# Altium footprint library Connector_Samtec_HLE_SMD.PcbLib: 290 footprints (part 8 of 24) (continued)
## Samtec_HLE-122-02-xxx-DV-BE_2x22_P2.54mm_Horizontal [mm]
pads (88):
  rect 1.27x1.68 smd: 1(-26.67,2.72) 2(-26.67,-2.72) 3(-24.13,2.72) 4(-24.13,-2.72) 5(-21.59,2.72) 6(-21.59,-2.72) 7(-19.05,2.72) 8(-19.05,-2.72) 9(-16.51,2.72) 10(-16.51,-2.72) 11(-13.97,2.72) 12(-13.97,-2.72) 13(-11.43,2.72) 14(-11.43,-2.72) 15(-8.89,2.72) 16(-8.89,-2.72) 17(-6.35,2.72) 18(-6.35,-2.72) 19(-3.81,2.72) 20(-3.81,-2.72) 21(-1.27,2.72) 22(-1.27,-2.72) 23(1.27,2.72) 24(1.27,-2.72) 25(3.81,2.72) 26(3.81,-2.72) 27(6.35,2.72) 28(6.35,-2.72) 29(8.89,2.72) 30(8.89,-2.72) 31(11.43,2.72) 32(11.43,-2.72) 33(13.97,2.72) 34(13.97,-2.72) 35(16.51,2.72) 36(16.51,-2.72) 37(19.05,2.72) 38(19.05,-2.72) 39(21.59,2.72) 40(21.59,-2.72) 41(24.13,2.72) 42(24.13,-2.72) 43(26.67,2.72) 44(26.67,-2.72)
  round 0.97 hole 0.97: Un1(11.43,-1.27) Un2(26.67,-1.27) Un3(-6.35,-1.27) Un4(13.97,1.27) Un5(6.35,1.27) Un6(-3.81,1.27) Un7(-21.59,-1.27) Un8(-26.67,1.27) Un9(3.81,1.27) Un10(-19.05,-1.27) Un11(1.27,1.27) Un12(11.43,1.27) Un13(1.27,-1.27) Un14(24.13,1.27) Un15(-13.97,-1.27) Un16(6.35,-1.27) Un17(-19.05,1.27) Un18(-13.97,1.27) Un19(3.81,-1.27) Un20(-16.51,-1.27) Un21(-11.43,1.27) Un22(-24.13,-1.27) Un23(-21.59,1.27) Un24(26.67,1.27) Un25(-24.13,1.27) Un26(-26.67,-1.27) Un27(-8.89,1.27) Un28(21.59,-1.27) Un29(13.97,-1.27) Un30(-8.89,-1.27) Un31(24.13,-1.27) Un32(-3.81,-1.27) Un33(21.59,1.27) Un34(8.89,1.27) Un35(8.89,-1.27) Un36(-1.27,-1.27) Un37(16.51,-1.27) Un38(-11.43,-1.27) Un39(-16.51,1.27) Un40(-6.35,1.27) Un41(-1.27,1.27) Un42(16.51,1.27) Un43(19.05,-1.27) Un44(19.05,1.27)
F.SilkS:
  lines w0.12: -27.565,-2.65 -28.05,-2.65 -28.05,2.65 -27.565,2.65 -27.565,3.56 ; -25.775,-2.65 -25.025,-2.65 ; -25.775,2.65 -25.025,2.65 ; -23.235,-2.65 -22.485,-2.65 ; -23.235,2.65 -22.485,2.65 ; -20.695,-2.65 -19.945,-2.65 ; -20.695,2.65 -19.945,2.65 ; -18.155,-2.65 -17.405,-2.65 ; -18.155,2.65 -17.405,2.65 ; -15.615,-2.65 -14.865,-2.65 ; -15.615,2.65 -14.865,2.65 ; -13.075,-2.65 -12.325,-2.65 ; -13.075,2.65 -12.325,2.65 ; -10.535,-2.65 -9.785,-2.65 ; -10.535,2.65 -9.785,2.65 ; -7.995,-2.65 -7.245,-2.65 ; -7.995,2.65 -7.245,2.65 ; -5.455,-2.65 -4.705,-2.65 ; -5.455,2.65 -4.705,2.65 ; -2.915,-2.65 -2.165,-2.65 ; -2.915,2.65 -2.165,2.65 ; -0.375,-2.65 0.375,-2.65 ; -0.375,2.65 0.375,2.65 ; 2.165,-2.65 2.915,-2.65 ; 2.165,2.65 2.915,2.65 ; 4.705,-2.65 5.455,-2.65 ; 4.705,2.65 5.455,2.65 ; 7.245,-2.65 7.995,-2.65 ; 7.245,2.65 7.995,2.65 ; 9.785,-2.65 10.535,-2.65 ; 9.785,2.65 10.535,2.65 ; 12.325,-2.65 13.075,-2.65 ; 12.325,2.65 13.075,2.65 ; 14.865,-2.65 15.615,-2.65 ; 14.865,2.65 15.615,2.65 ; 17.405,-2.65 18.155,-2.65 ; 17.405,2.65 18.155,2.65 ; 19.945,-2.65 20.695,-2.65 ; 19.945,2.65 20.695,2.65 ; 22.485,-2.65 23.235,-2.65 ; 22.485,2.65 23.235,2.65 ; 25.025,-2.65 25.775,-2.65 ; 25.025,2.65 25.775,2.65 ; 27.565,-2.65 28.05,-2.65 28.05,2.65 27.565,2.65
F.CrtYd:
  lines w0.05: -28.44,-4.06 -28.44,4.06 28.44,4.06 28.44,-4.06 -28.44,-4.06
F.Fab:
  lines w0.1: -27.17,2.54 -26.67,1.833 -26.17,2.54 ; -27.94,-2.54 -27.94,2.54 27.94,2.54 27.94,-2.54 -27.94,-2.54
  text "'.Designator'" at -4.047,-2.68 h1

## Samtec_HLE-122-02-xxx-DV-LC_2x22_P2.54mm_Horizontal [mm]
pads (46):
  rect 1.27x2.29 smd: 1(-26.67,2.525) 2(-26.67,-2.525) 3(-24.13,2.525) 4(-24.13,-2.525) 5(-21.59,2.525) 6(-21.59,-2.525) 7(-19.05,2.525) 8(-19.05,-2.525) 9(-16.51,2.525) 10(-16.51,-2.525) 11(-13.97,2.525) 12(-13.97,-2.525) 13(-11.43,2.525) 14(-11.43,-2.525) 15(-8.89,2.525) 16(-8.89,-2.525) 17(-6.35,2.525) 18(-6.35,-2.525) 19(-3.81,2.525) 20(-3.81,-2.525) 21(-1.27,2.525) 22(-1.27,-2.525) 23(1.27,2.525) 24(1.27,-2.525) 25(3.81,2.525) 26(3.81,-2.525) 27(6.35,2.525) 28(6.35,-2.525) 29(8.89,2.525) 30(8.89,-2.525) 31(11.43,2.525) 32(11.43,-2.525) 33(13.97,2.525) 34(13.97,-2.525) 35(16.51,2.525) 36(16.51,-2.525) 37(19.05,2.525) 38(19.05,-2.525) 39(21.59,2.525) 40(21.59,-2.525) 41(24.13,2.525) 42(24.13,-2.525) 43(26.67,2.525) 44(26.67,-2.525)
  round 1.19 hole 1.19: Un1(-25.4,0) Un2(25.4,0)
F.SilkS:
  lines w0.12: -27.565,-2.65 -28.05,-2.65 -28.05,2.65 -27.565,2.65 -27.565,3.67 ; -25.775,-2.65 -25.025,-2.65 ; -25.775,2.65 -25.025,2.65 ; -23.235,-2.65 -22.485,-2.65 ; -23.235,2.65 -22.485,2.65 ; -20.695,-2.65 -19.945,-2.65 ; -20.695,2.65 -19.945,2.65 ; -18.155,-2.65 -17.405,-2.65 ; -18.155,2.65 -17.405,2.65 ; -15.615,-2.65 -14.865,-2.65 ; -15.615,2.65 -14.865,2.65 ; -13.075,-2.65 -12.325,-2.65 ; -13.075,2.65 -12.325,2.65 ; -10.535,-2.65 -9.785,-2.65 ; -10.535,2.65 -9.785,2.65 ; -7.995,-2.65 -7.245,-2.65 ; -7.995,2.65 -7.245,2.65 ; -5.455,-2.65 -4.705,-2.65 ; -5.455,2.65 -4.705,2.65 ; -2.915,-2.65 -2.165,-2.65 ; -2.915,2.65 -2.165,2.65 ; -0.375,-2.65 0.375,-2.65 ; -0.375,2.65 0.375,2.65 ; 2.165,-2.65 2.915,-2.65 ; 2.165,2.65 2.915,2.65 ; 4.705,-2.65 5.455,-2.65 ; 4.705,2.65 5.455,2.65 ; 7.245,-2.65 7.995,-2.65 ; 7.245,2.65 7.995,2.65 ; 9.785,-2.65 10.535,-2.65 ; 9.785,2.65 10.535,2.65 ; 12.325,-2.65 13.075,-2.65 ; 12.325,2.65 13.075,2.65 ; 14.865,-2.65 15.615,-2.65 ; 14.865,2.65 15.615,2.65 ; 17.405,-2.65 18.155,-2.65 ; 17.405,2.65 18.155,2.65 ; 19.945,-2.65 20.695,-2.65 ; 19.945,2.65 20.695,2.65 ; 22.485,-2.65 23.235,-2.65 ; 22.485,2.65 23.235,2.65 ; 25.025,-2.65 25.775,-2.65 ; 25.025,2.65 25.775,2.65 ; 27.565,-2.65 28.05,-2.65 28.05,2.65 27.565,2.65
F.CrtYd:
  lines w0.05: -28.44,-4.17 -28.44,4.17 28.44,4.17 28.44,-4.17 -28.44,-4.17
F.Fab:
  lines w0.1: -27.17,2.54 -26.67,1.833 -26.17,2.54 ; -27.94,-2.54 -27.94,2.54 27.94,2.54 27.94,-2.54 -27.94,-2.54
  text "'.Designator'" at -4.047,-2.68 h1

## Samtec_HLE-122-02-xxx-DV_2x22_P2.54mm_Horizontal [mm]
pads (44):
  rect 1.27x2.29 smd: 1(-26.67,2.525) 2(-26.67,-2.525) 3(-24.13,2.525) 4(-24.13,-2.525) 5(-21.59,2.525) 6(-21.59,-2.525) 7(-19.05,2.525) 8(-19.05,-2.525) 9(-16.51,2.525) 10(-16.51,-2.525) 11(-13.97,2.525) 12(-13.97,-2.525) 13(-11.43,2.525) 14(-11.43,-2.525) 15(-8.89,2.525) 16(-8.89,-2.525) 17(-6.35,2.525) 18(-6.35,-2.525) 19(-3.81,2.525) 20(-3.81,-2.525) 21(-1.27,2.525) 22(-1.27,-2.525) 23(1.27,2.525) 24(1.27,-2.525) 25(3.81,2.525) 26(3.81,-2.525) 27(6.35,2.525) 28(6.35,-2.525) 29(8.89,2.525) 30(8.89,-2.525) 31(11.43,2.525) 32(11.43,-2.525) 33(13.97,2.525) 34(13.97,-2.525) 35(16.51,2.525) 36(16.51,-2.525) 37(19.05,2.525) 38(19.05,-2.525) 39(21.59,2.525) 40(21.59,-2.525) 41(24.13,2.525) 42(24.13,-2.525) 43(26.67,2.525) 44(26.67,-2.525)
F.SilkS:
  lines w0.12: -27.565,-2.65 -28.05,-2.65 -28.05,2.65 -27.565,2.65 -27.565,3.67 ; -25.775,-2.65 -25.025,-2.65 ; -25.775,2.65 -25.025,2.65 ; -23.235,-2.65 -22.485,-2.65 ; -23.235,2.65 -22.485,2.65 ; -20.695,-2.65 -19.945,-2.65 ; -20.695,2.65 -19.945,2.65 ; -18.155,-2.65 -17.405,-2.65 ; -18.155,2.65 -17.405,2.65 ; -15.615,-2.65 -14.865,-2.65 ; -15.615,2.65 -14.865,2.65 ; -13.075,-2.65 -12.325,-2.65 ; -13.075,2.65 -12.325,2.65 ; -10.535,-2.65 -9.785,-2.65 ; -10.535,2.65 -9.785,2.65 ; -7.995,-2.65 -7.245,-2.65 ; -7.995,2.65 -7.245,2.65 ; -5.455,-2.65 -4.705,-2.65 ; -5.455,2.65 -4.705,2.65 ; -2.915,-2.65 -2.165,-2.65 ; -2.915,2.65 -2.165,2.65 ; -0.375,-2.65 0.375,-2.65 ; -0.375,2.65 0.375,2.65 ; 2.165,-2.65 2.915,-2.65 ; 2.165,2.65 2.915,2.65 ; 4.705,-2.65 5.455,-2.65 ; 4.705,2.65 5.455,2.65 ; 7.245,-2.65 7.995,-2.65 ; 7.245,2.65 7.995,2.65 ; 9.785,-2.65 10.535,-2.65 ; 9.785,2.65 10.535,2.65 ; 12.325,-2.65 13.075,-2.65 ; 12.325,2.65 13.075,2.65 ; 14.865,-2.65 15.615,-2.65 ; 14.865,2.65 15.615,2.65 ; 17.405,-2.65 18.155,-2.65 ; 17.405,2.65 18.155,2.65 ; 19.945,-2.65 20.695,-2.65 ; 19.945,2.65 20.695,2.65 ; 22.485,-2.65 23.235,-2.65 ; 22.485,2.65 23.235,2.65 ; 25.025,-2.65 25.775,-2.65 ; 25.025,2.65 25.775,2.65 ; 27.565,-2.65 28.05,-2.65 28.05,2.65 27.565,2.65
F.CrtYd:
  lines w0.05: -28.44,-4.17 28.44,-4.17 28.44,4.17 -28.44,4.17 -28.44,-4.17
F.Fab:
  lines w0.1: -27.17,2.54 -26.67,1.833 -26.17,2.54 ; -27.94,-2.54 27.94,-2.54 27.94,2.54 -27.94,2.54 -27.94,-2.54
  text "'.Designator'" at -4.047,-2.68 h1

## Samtec_HLE-123-02-xxx-DV-A_2x23_P2.54mm_Horizontal [mm]
pads (48):
  rect 1.27x2.29 smd: 1(-27.94,2.525) 2(-27.94,-2.525) 3(-25.4,2.525) 4(-25.4,-2.525) 5(-22.86,2.525) 6(-22.86,-2.525) 7(-20.32,2.525) 8(-20.32,-2.525) 9(-17.78,2.525) 10(-17.78,-2.525) 11(-15.24,2.525) 12(-15.24,-2.525) 13(-12.7,2.525) 14(-12.7,-2.525) 15(-10.16,2.525) 16(-10.16,-2.525) 17(-7.62,2.525) 18(-7.62,-2.525) 19(-5.08,2.525) 20(-5.08,-2.525) 21(-2.54,2.525) 22(-2.54,-2.525) 23(0,2.525) 24(0,-2.525) 25(2.54,2.525) 26(2.54,-2.525) 27(5.08,2.525) 28(5.08,-2.525) 29(7.62,2.525) 30(7.62,-2.525) 31(10.16,2.525) 32(10.16,-2.525) 33(12.7,2.525) 34(12.7,-2.525) 35(15.24,2.525) 36(15.24,-2.525) 37(17.78,2.525) 38(17.78,-2.525) 39(20.32,2.525) 40(20.32,-2.525) 41(22.86,2.525) 42(22.86,-2.525) 43(25.4,2.525) 44(25.4,-2.525) 45(27.94,2.525) 46(27.94,-2.525)
  round 1.78 hole 1.78: Un1(-26.67,0) Un2(26.67,0)
F.SilkS:
  lines w0.12: -28.835,-2.65 -29.32,-2.65 -29.32,2.65 -28.835,2.65 -28.835,3.67 ; -27.045,-2.65 -26.295,-2.65 ; -27.045,2.65 -26.295,2.65 ; -24.505,-2.65 -23.755,-2.65 ; -24.505,2.65 -23.755,2.65 ; -21.965,-2.65 -21.215,-2.65 ; -21.965,2.65 -21.215,2.65 ; -19.425,-2.65 -18.675,-2.65 ; -19.425,2.65 -18.675,2.65 ; -16.885,-2.65 -16.135,-2.65 ; -16.885,2.65 -16.135,2.65 ; -14.345,-2.65 -13.595,-2.65 ; -14.345,2.65 -13.595,2.65 ; -11.805,-2.65 -11.055,-2.65 ; -11.805,2.65 -11.055,2.65 ; -9.265,-2.65 -8.515,-2.65 ; -9.265,2.65 -8.515,2.65 ; -6.725,-2.65 -5.975,-2.65 ; -6.725,2.65 -5.975,2.65 ; -4.185,-2.65 -3.435,-2.65 ; -4.185,2.65 -3.435,2.65 ; -1.645,-2.65 -0.895,-2.65 ; -1.645,2.65 -0.895,2.65 ; 0.895,-2.65 1.645,-2.65 ; 0.895,2.65 1.645,2.65 ; 3.435,-2.65 4.185,-2.65 ; 3.435,2.65 4.185,2.65 ; 5.975,-2.65 6.725,-2.65 ; 5.975,2.65 6.725,2.65 ; 8.515,-2.65 9.265,-2.65 ; 8.515,2.65 9.265,2.65 ; 11.055,-2.65 11.805,-2.65 ; 11.055,2.65 11.805,2.65 ; 13.595,-2.65 14.345,-2.65 ; 13.595,2.65 14.345,2.65 ; 16.135,-2.65 16.885,-2.65 ; 16.135,2.65 16.885,2.65 ; 18.675,-2.65 19.425,-2.65 ; 18.675,2.65 19.425,2.65 ; 21.215,-2.65 21.965,-2.65 ; 21.215,2.65 21.965,2.65 ; 23.755,-2.65 24.505,-2.65 ; 23.755,2.65 24.505,2.65 ; 26.295,-2.65 27.045,-2.65 ; 26.295,2.65 27.045,2.65 ; 28.835,-2.65 29.32,-2.65 29.32,2.65 28.835,2.65
F.CrtYd:
  lines w0.05: -29.71,-4.17 -29.71,4.17 29.71,4.17 29.71,-4.17 -29.71,-4.17
F.Fab:
  lines w0.1: -28.44,2.54 -27.94,1.833 -27.44,2.54 ; -29.21,-2.54 -29.21,2.54 29.21,2.54 29.21,-2.54 -29.21,-2.54
  text "'.Designator'" at -4.047,-2.68 h1

## Samtec_HLE-123-02-xxx-DV-BE-A_2x23_P2.54mm_Horizontal [mm]
pads (94):
  rect 1.27x1.68 smd: 1(-27.94,2.72) 2(-27.94,-2.72) 3(-25.4,2.72) 4(-25.4,-2.72) 5(-22.86,2.72) 6(-22.86,-2.72) 7(-20.32,2.72) 8(-20.32,-2.72) 9(-17.78,2.72) 10(-17.78,-2.72) 11(-15.24,2.72) 12(-15.24,-2.72) 13(-12.7,2.72) 14(-12.7,-2.72) 15(-10.16,2.72) 16(-10.16,-2.72) 17(-7.62,2.72) 18(-7.62,-2.72) 19(-5.08,2.72) 20(-5.08,-2.72) 21(-2.54,2.72) 22(-2.54,-2.72) 23(0,2.72) 24(0,-2.72) 25(2.54,2.72) 26(2.54,-2.72) 27(5.08,2.72) 28(5.08,-2.72) 29(7.62,2.72) 30(7.62,-2.72) 31(10.16,2.72) 32(10.16,-2.72) 33(12.7,2.72) 34(12.7,-2.72) 35(15.24,2.72) 36(15.24,-2.72) 37(17.78,2.72) 38(17.78,-2.72) 39(20.32,2.72) 40(20.32,-2.72) 41(22.86,2.72) 42(22.86,-2.72) 43(25.4,2.72) 44(25.4,-2.72) 45(27.94,2.72) 46(27.94,-2.72)
  round 0.97 hole 0.97: Un1(10.16,-1.27) Un2(-5.08,-1.27) Un3(-10.16,-1.27) Un4(-15.24,-1.27) Un5(-10.16,1.27) Un6(25.4,1.27) Un7(22.86,-1.27) Un8(20.32,1.27) Un9(10.16,1.27) Un10(15.24,1.27) Un11(12.7,1.27) Un13(5.08,1.27) Un14(27.94,-1.27) Un15(-2.54,-1.27) Un16(-20.32,1.27) Un17(0,1.27) Un18(-7.62,-1.27) Un20(2.54,-1.27) Un21(12.7,-1.27) Un22(27.94,1.27) Un23(5.08,-1.27) Un24(-27.94,-1.27) Un25(-25.4,1.27) Un26(-25.4,-1.27) Un27(25.4,-1.27) Un28(15.24,-1.27) Un29(-20.32,-1.27) Un30(7.62,1.27) Un31(-22.86,1.27) Un32(-15.24,1.27) Un33(-2.54,1.27) Un34(20.32,-1.27) Un35(0,-1.27) Un36(-12.7,-1.27) Un37(22.86,1.27) Un38(-22.86,-1.27) Un39(17.78,1.27) Un40(7.62,-1.27) Un41(-12.7,1.27) Un42(-5.08,1.27) Un43(-17.78,1.27) Un44(17.78,-1.27) Un45(-17.78,-1.27) Un46(-27.94,1.27) Un47(2.54,1.27) Un48(-7.62,1.27)
  round 1.78 hole 1.78: Un12(26.67,0) Un19(-26.67,0)
F.SilkS:
  lines w0.12: -28.835,-2.65 -29.32,-2.65 -29.32,2.65 -28.835,2.65 -28.835,3.56 ; -27.045,-2.65 -26.295,-2.65 ; -27.045,2.65 -26.295,2.65 ; -24.505,-2.65 -23.755,-2.65 ; -24.505,2.65 -23.755,2.65 ; -21.965,-2.65 -21.215,-2.65 ; -21.965,2.65 -21.215,2.65 ; -19.425,-2.65 -18.675,-2.65 ; -19.425,2.65 -18.675,2.65 ; -16.885,-2.65 -16.135,-2.65 ; -16.885,2.65 -16.135,2.65 ; -14.345,-2.65 -13.595,-2.65 ; -14.345,2.65 -13.595,2.65 ; -11.805,-2.65 -11.055,-2.65 ; -11.805,2.65 -11.055,2.65 ; -9.265,-2.65 -8.515,-2.65 ; -9.265,2.65 -8.515,2.65 ; -6.725,-2.65 -5.975,-2.65 ; -6.725,2.65 -5.975,2.65 ; -4.185,-2.65 -3.435,-2.65 ; -4.185,2.65 -3.435,2.65 ; -1.645,-2.65 -0.895,-2.65 ; -1.645,2.65 -0.895,2.65 ; 0.895,-2.65 1.645,-2.65 ; 0.895,2.65 1.645,2.65 ; 3.435,-2.65 4.185,-2.65 ; 3.435,2.65 4.185,2.65 ; 5.975,-2.65 6.725,-2.65 ; 5.975,2.65 6.725,2.65 ; 8.515,-2.65 9.265,-2.65 ; 8.515,2.65 9.265,2.65 ; 11.055,-2.65 11.805,-2.65 ; 11.055,2.65 11.805,2.65 ; 13.595,-2.65 14.345,-2.65 ; 13.595,2.65 14.345,2.65 ; 16.135,-2.65 16.885,-2.65 ; 16.135,2.65 16.885,2.65 ; 18.675,-2.65 19.425,-2.65 ; 18.675,2.65 19.425,2.65 ; 21.215,-2.65 21.965,-2.65 ; 21.215,2.65 21.965,2.65 ; 23.755,-2.65 24.505,-2.65 ; 23.755,2.65 24.505,2.65 ; 26.295,-2.65 27.045,-2.65 ; 26.295,2.65 27.045,2.65 ; 28.835,-2.65 29.32,-2.65 29.32,2.65 28.835,2.65
F.CrtYd:
  lines w0.05: -29.71,-4.06 29.71,-4.06 29.71,4.06 -29.71,4.06 -29.71,-4.06
F.Fab:
  lines w0.1: -28.44,2.54 -27.94,1.833 -27.44,2.54 ; -29.21,-2.54 29.21,-2.54 29.21,2.54 -29.21,2.54 -29.21,-2.54
  text "'.Designator'" at -4.047,-2.68 h1

## Samtec_HLE-123-02-xxx-DV-BE-LC_2x23_P2.54mm_Horizontal [mm]
pads (94):
  rect 1.27x1.68 smd: 1(-27.94,2.72) 2(-27.94,-2.72) 3(-25.4,2.72) 4(-25.4,-2.72) 5(-22.86,2.72) 6(-22.86,-2.72) 7(-20.32,2.72) 8(-20.32,-2.72) 9(-17.78,2.72) 10(-17.78,-2.72) 11(-15.24,2.72) 12(-15.24,-2.72) 13(-12.7,2.72) 14(-12.7,-2.72) 15(-10.16,2.72) 16(-10.16,-2.72) 17(-7.62,2.72) 18(-7.62,-2.72) 19(-5.08,2.72) 20(-5.08,-2.72) 21(-2.54,2.72) 22(-2.54,-2.72) 23(0,2.72) 24(0,-2.72) 25(2.54,2.72) 26(2.54,-2.72) 27(5.08,2.72) 28(5.08,-2.72) 29(7.62,2.72) 30(7.62,-2.72) 31(10.16,2.72) 32(10.16,-2.72) 33(12.7,2.72) 34(12.7,-2.72) 35(15.24,2.72) 36(15.24,-2.72) 37(17.78,2.72) 38(17.78,-2.72) 39(20.32,2.72) 40(20.32,-2.72) 41(22.86,2.72) 42(22.86,-2.72) 43(25.4,2.72) 44(25.4,-2.72) 45(27.94,2.72) 46(27.94,-2.72)
  round 0.97 hole 0.97: Un1(-17.78,1.27) Un2(-27.94,-1.27) Un3(17.78,-1.27) Un4(-17.78,-1.27) Un5(-15.24,1.27) Un6(10.16,-1.27) Un7(7.62,1.27) Un8(-5.08,-1.27) Un9(22.86,1.27) Un11(2.54,1.27) Un12(-15.24,-1.27) Un13(-27.94,1.27) Un14(-5.08,1.27) Un15(2.54,-1.27) Un16(-2.54,1.27) Un17(-7.62,-1.27) Un18(12.7,1.27) Un19(-22.86,-1.27) Un20(-7.62,1.27) Un21(17.78,1.27) Un22(20.32,-1.27) Un23(25.4,1.27) Un24(5.08,1.27) Un26(0,1.27) Un27(-10.16,1.27) Un28(-25.4,1.27) Un29(20.32,1.27) Un30(-12.7,1.27) Un31(7.62,-1.27) Un32(15.24,-1.27) Un33(0,-1.27) Un34(-22.86,1.27) Un35(-25.4,-1.27) Un36(-10.16,-1.27) Un37(27.94,-1.27) Un38(12.7,-1.27) Un39(-12.7,-1.27) Un40(15.24,1.27) Un41(-2.54,-1.27) Un42(-20.32,1.27) Un43(10.16,1.27) Un44(27.94,1.27) Un45(5.08,-1.27) Un46(25.4,-1.27) Un47(22.86,-1.27) Un48(-20.32,-1.27)
  round 1.19 hole 1.19: Un10(-26.67,0) Un25(26.67,0)
F.SilkS:
  lines w0.12: -28.835,-2.65 -29.32,-2.65 -29.32,2.65 -28.835,2.65 -28.835,3.56 ; -27.045,-2.65 -26.295,-2.65 ; -27.045,2.65 -26.295,2.65 ; -24.505,-2.65 -23.755,-2.65 ; -24.505,2.65 -23.755,2.65 ; -21.965,-2.65 -21.215,-2.65 ; -21.965,2.65 -21.215,2.65 ; -19.425,-2.65 -18.675,-2.65 ; -19.425,2.65 -18.675,2.65 ; -16.885,-2.65 -16.135,-2.65 ; -16.885,2.65 -16.135,2.65 ; -14.345,-2.65 -13.595,-2.65 ; -14.345,2.65 -13.595,2.65 ; -11.805,-2.65 -11.055,-2.65 ; -11.805,2.65 -11.055,2.65 ; -9.265,-2.65 -8.515,-2.65 ; -9.265,2.65 -8.515,2.65 ; -6.725,-2.65 -5.975,-2.65 ; -6.725,2.65 -5.975,2.65 ; -4.185,-2.65 -3.435,-2.65 ; -4.185,2.65 -3.435,2.65 ; -1.645,-2.65 -0.895,-2.65 ; -1.645,2.65 -0.895,2.65 ; 0.895,-2.65 1.645,-2.65 ; 0.895,2.65 1.645,2.65 ; 3.435,-2.65 4.185,-2.65 ; 3.435,2.65 4.185,2.65 ; 5.975,-2.65 6.725,-2.65 ; 5.975,2.65 6.725,2.65 ; 8.515,-2.65 9.265,-2.65 ; 8.515,2.65 9.265,2.65 ; 11.055,-2.65 11.805,-2.65 ; 11.055,2.65 11.805,2.65 ; 13.595,-2.65 14.345,-2.65 ; 13.595,2.65 14.345,2.65 ; 16.135,-2.65 16.885,-2.65 ; 16.135,2.65 16.885,2.65 ; 18.675,-2.65 19.425,-2.65 ; 18.675,2.65 19.425,2.65 ; 21.215,-2.65 21.965,-2.65 ; 21.215,2.65 21.965,2.65 ; 23.755,-2.65 24.505,-2.65 ; 23.755,2.65 24.505,2.65 ; 26.295,-2.65 27.045,-2.65 ; 26.295,2.65 27.045,2.65 ; 28.835,-2.65 29.32,-2.65 29.32,2.65 28.835,2.65
F.CrtYd:
  lines w0.05: -29.71,-4.06 29.71,-4.06 29.71,4.06 -29.71,4.06 -29.71,-4.06
F.Fab:
  lines w0.1: -28.44,2.54 -27.94,1.833 -27.44,2.54 ; -29.21,-2.54 -29.21,2.54 29.21,2.54 29.21,-2.54 -29.21,-2.54
  text "'.Designator'" at -4.047,-2.68 h1

## Samtec_HLE-123-02-xxx-DV-BE_2x23_P2.54mm_Horizontal [mm]
pads (92):
  rect 1.27x1.68 smd: 1(-27.94,2.72) 2(-27.94,-2.72) 3(-25.4,2.72) 4(-25.4,-2.72) 5(-22.86,2.72) 6(-22.86,-2.72) 7(-20.32,2.72) 8(-20.32,-2.72) 9(-17.78,2.72) 10(-17.78,-2.72) 11(-15.24,2.72) 12(-15.24,-2.72) 13(-12.7,2.72) 14(-12.7,-2.72) 15(-10.16,2.72) 16(-10.16,-2.72) 17(-7.62,2.72) 18(-7.62,-2.72) 19(-5.08,2.72) 20(-5.08,-2.72) 21(-2.54,2.72) 22(-2.54,-2.72) 23(0,2.72) 24(0,-2.72) 25(2.54,2.72) 26(2.54,-2.72) 27(5.08,2.72) 28(5.08,-2.72) 29(7.62,2.72) 30(7.62,-2.72) 31(10.16,2.72) 32(10.16,-2.72) 33(12.7,2.72) 34(12.7,-2.72) 35(15.24,2.72) 36(15.24,-2.72) 37(17.78,2.72) 38(17.78,-2.72) 39(20.32,2.72) 40(20.32,-2.72) 41(22.86,2.72) 42(22.86,-2.72) 43(25.4,2.72) 44(25.4,-2.72) 45(27.94,2.72) 46(27.94,-2.72)
  round 0.97 hole 0.97: Un1(2.54,1.27) Un2(10.16,-1.27) Un3(5.08,-1.27) Un4(-15.24,-1.27) Un5(7.62,-1.27) Un6(10.16,1.27) Un7(7.62,1.27) Un8(5.08,1.27) Un9(25.4,-1.27) Un10(22.86,1.27) Un11(15.24,1.27) Un12(-20.32,1.27) Un13(22.86,-1.27) Un14(-27.94,-1.27) Un15(-22.86,1.27) Un16(12.7,1.27) Un17(-5.08,1.27) Un18(-25.4,1.27) Un19(25.4,1.27) Un20(-2.54,1.27) Un21(20.32,-1.27) Un22(-22.86,-1.27) Un23(27.94,-1.27) Un24(0,1.27) Un25(-25.4,-1.27) Un26(-20.32,-1.27) Un27(-17.78,-1.27) Un28(17.78,-1.27) Un29(-2.54,-1.27) Un30(-10.16,1.27) Un31(2.54,-1.27) Un32(-5.08,-1.27) Un33(-7.62,-1.27) Un34(17.78,1.27) Un35(0,-1.27) Un36(27.94,1.27) Un37(-10.16,-1.27) Un38(12.7,-1.27) Un39(-12.7,1.27) Un40(-27.94,1.27) Un41(-15.24,1.27) Un42(-7.62,1.27) Un43(-17.78,1.27) Un44(15.24,-1.27) Un45(-12.7,-1.27) Un46(20.32,1.27)
F.SilkS:
  lines w0.12: -28.835,-2.65 -29.32,-2.65 -29.32,2.65 -28.835,2.65 -28.835,3.56 ; -27.045,-2.65 -26.295,-2.65 ; -27.045,2.65 -26.295,2.65 ; -24.505,-2.65 -23.755,-2.65 ; -24.505,2.65 -23.755,2.65 ; -21.965,-2.65 -21.215,-2.65 ; -21.965,2.65 -21.215,2.65 ; -19.425,-2.65 -18.675,-2.65 ; -19.425,2.65 -18.675,2.65 ; -16.885,-2.65 -16.135,-2.65 ; -16.885,2.65 -16.135,2.65 ; -14.345,-2.65 -13.595,-2.65 ; -14.345,2.65 -13.595,2.65 ; -11.805,-2.65 -11.055,-2.65 ; -11.805,2.65 -11.055,2.65 ; -9.265,-2.65 -8.515,-2.65 ; -9.265,2.65 -8.515,2.65 ; -6.725,-2.65 -5.975,-2.65 ; -6.725,2.65 -5.975,2.65 ; -4.185,-2.65 -3.435,-2.65 ; -4.185,2.65 -3.435,2.65 ; -1.645,-2.65 -0.895,-2.65 ; -1.645,2.65 -0.895,2.65 ; 0.895,-2.65 1.645,-2.65 ; 0.895,2.65 1.645,2.65 ; 3.435,-2.65 4.185,-2.65 ; 3.435,2.65 4.185,2.65 ; 5.975,-2.65 6.725,-2.65 ; 5.975,2.65 6.725,2.65 ; 8.515,-2.65 9.265,-2.65 ; 8.515,2.65 9.265,2.65 ; 11.055,-2.65 11.805,-2.65 ; 11.055,2.65 11.805,2.65 ; 13.595,-2.65 14.345,-2.65 ; 13.595,2.65 14.345,2.65 ; 16.135,-2.65 16.885,-2.65 ; 16.135,2.65 16.885,2.65 ; 18.675,-2.65 19.425,-2.65 ; 18.675,2.65 19.425,2.65 ; 21.215,-2.65 21.965,-2.65 ; 21.215,2.65 21.965,2.65 ; 23.755,-2.65 24.505,-2.65 ; 23.755,2.65 24.505,2.65 ; 26.295,-2.65 27.045,-2.65 ; 26.295,2.65 27.045,2.65 ; 28.835,-2.65 29.32,-2.65 29.32,2.65 28.835,2.65
F.CrtYd:
  lines w0.05: -29.71,-4.06 29.71,-4.06 29.71,4.06 -29.71,4.06 -29.71,-4.06
F.Fab:
  lines w0.1: -28.44,2.54 -27.94,1.833 -27.44,2.54 ; -29.21,-2.54 29.21,-2.54 29.21,2.54 -29.21,2.54 -29.21,-2.54
  text "'.Designator'" at -4.047,-2.68 h1

## Samtec_HLE-123-02-xxx-DV-LC_2x23_P2.54mm_Horizontal [mm]
pads (48):
  rect 1.27x2.29 smd: 1(-27.94,2.525) 2(-27.94,-2.525) 3(-25.4,2.525) 4(-25.4,-2.525) 5(-22.86,2.525) 6(-22.86,-2.525) 7(-20.32,2.525) 8(-20.32,-2.525) 9(-17.78,2.525) 10(-17.78,-2.525) 11(-15.24,2.525) 12(-15.24,-2.525) 13(-12.7,2.525) 14(-12.7,-2.525) 15(-10.16,2.525) 16(-10.16,-2.525) 17(-7.62,2.525) 18(-7.62,-2.525) 19(-5.08,2.525) 20(-5.08,-2.525) 21(-2.54,2.525) 22(-2.54,-2.525) 23(0,2.525) 24(0,-2.525) 25(2.54,2.525) 26(2.54,-2.525) 27(5.08,2.525) 28(5.08,-2.525) 29(7.62,2.525) 30(7.62,-2.525) 31(10.16,2.525) 32(10.16,-2.525) 33(12.7,2.525) 34(12.7,-2.525) 35(15.24,2.525) 36(15.24,-2.525) 37(17.78,2.525) 38(17.78,-2.525) 39(20.32,2.525) 40(20.32,-2.525) 41(22.86,2.525) 42(22.86,-2.525) 43(25.4,2.525) 44(25.4,-2.525) 45(27.94,2.525) 46(27.94,-2.525)
  round 1.19 hole 1.19: Un1(26.67,0) Un2(-26.67,0)
F.SilkS:
  lines w0.12: -28.835,-2.65 -29.32,-2.65 -29.32,2.65 -28.835,2.65 -28.835,3.67 ; -27.045,-2.65 -26.295,-2.65 ; -27.045,2.65 -26.295,2.65 ; -24.505,-2.65 -23.755,-2.65 ; -24.505,2.65 -23.755,2.65 ; -21.965,-2.65 -21.215,-2.65 ; -21.965,2.65 -21.215,2.65 ; -19.425,-2.65 -18.675,-2.65 ; -19.425,2.65 -18.675,2.65 ; -16.885,-2.65 -16.135,-2.65 ; -16.885,2.65 -16.135,2.65 ; -14.345,-2.65 -13.595,-2.65 ; -14.345,2.65 -13.595,2.65 ; -11.805,-2.65 -11.055,-2.65 ; -11.805,2.65 -11.055,2.65 ; -9.265,-2.65 -8.515,-2.65 ; -9.265,2.65 -8.515,2.65 ; -6.725,-2.65 -5.975,-2.65 ; -6.725,2.65 -5.975,2.65 ; -4.185,-2.65 -3.435,-2.65 ; -4.185,2.65 -3.435,2.65 ; -1.645,-2.65 -0.895,-2.65 ; -1.645,2.65 -0.895,2.65 ; 0.895,-2.65 1.645,-2.65 ; 0.895,2.65 1.645,2.65 ; 3.435,-2.65 4.185,-2.65 ; 3.435,2.65 4.185,2.65 ; 5.975,-2.65 6.725,-2.65 ; 5.975,2.65 6.725,2.65 ; 8.515,-2.65 9.265,-2.65 ; 8.515,2.65 9.265,2.65 ; 11.055,-2.65 11.805,-2.65 ; 11.055,2.65 11.805,2.65 ; 13.595,-2.65 14.345,-2.65 ; 13.595,2.65 14.345,2.65 ; 16.135,-2.65 16.885,-2.65 ; 16.135,2.65 16.885,2.65 ; 18.675,-2.65 19.425,-2.65 ; 18.675,2.65 19.425,2.65 ; 21.215,-2.65 21.965,-2.65 ; 21.215,2.65 21.965,2.65 ; 23.755,-2.65 24.505,-2.65 ; 23.755,2.65 24.505,2.65 ; 26.295,-2.65 27.045,-2.65 ; 26.295,2.65 27.045,2.65 ; 28.835,-2.65 29.32,-2.65 29.32,2.65 28.835,2.65
F.CrtYd:
  lines w0.05: -29.71,-4.17 -29.71,4.17 29.71,4.17 29.71,-4.17 -29.71,-4.17
F.Fab:
  lines w0.1: -28.44,2.54 -27.94,1.833 -27.44,2.54 ; -29.21,-2.54 29.21,-2.54 29.21,2.54 -29.21,2.54 -29.21,-2.54
  text "'.Designator'" at -4.047,-2.68 h1

## Samtec_HLE-123-02-xxx-DV_2x23_P2.54mm_Horizontal [mm]
pads (46):
  rect 1.27x2.29 smd: 1(-27.94,2.525) 2(-27.94,-2.525) 3(-25.4,2.525) 4(-25.4,-2.525) 5(-22.86,2.525) 6(-22.86,-2.525) 7(-20.32,2.525) 8(-20.32,-2.525) 9(-17.78,2.525) 10(-17.78,-2.525) 11(-15.24,2.525) 12(-15.24,-2.525) 13(-12.7,2.525) 14(-12.7,-2.525) 15(-10.16,2.525) 16(-10.16,-2.525) 17(-7.62,2.525) 18(-7.62,-2.525) 19(-5.08,2.525) 20(-5.08,-2.525) 21(-2.54,2.525) 22(-2.54,-2.525) 23(0,2.525) 24(0,-2.525) 25(2.54,2.525) 26(2.54,-2.525) 27(5.08,2.525) 28(5.08,-2.525) 29(7.62,2.525) 30(7.62,-2.525) 31(10.16,2.525) 32(10.16,-2.525) 33(12.7,2.525) 34(12.7,-2.525) 35(15.24,2.525) 36(15.24,-2.525) 37(17.78,2.525) 38(17.78,-2.525) 39(20.32,2.525) 40(20.32,-2.525) 41(22.86,2.525) 42(22.86,-2.525) 43(25.4,2.525) 44(25.4,-2.525) 45(27.94,2.525) 46(27.94,-2.525)
F.SilkS:
  lines w0.12: -28.835,-2.65 -29.32,-2.65 -29.32,2.65 -28.835,2.65 -28.835,3.67 ; -27.045,-2.65 -26.295,-2.65 ; -27.045,2.65 -26.295,2.65 ; -24.505,-2.65 -23.755,-2.65 ; -24.505,2.65 -23.755,2.65 ; -21.965,-2.65 -21.215,-2.65 ; -21.965,2.65 -21.215,2.65 ; -19.425,-2.65 -18.675,-2.65 ; -19.425,2.65 -18.675,2.65 ; -16.885,-2.65 -16.135,-2.65 ; -16.885,2.65 -16.135,2.65 ; -14.345,-2.65 -13.595,-2.65 ; -14.345,2.65 -13.595,2.65 ; -11.805,-2.65 -11.055,-2.65 ; -11.805,2.65 -11.055,2.65 ; -9.265,-2.65 -8.515,-2.65 ; -9.265,2.65 -8.515,2.65 ; -6.725,-2.65 -5.975,-2.65 ; -6.725,2.65 -5.975,2.65 ; -4.185,-2.65 -3.435,-2.65 ; -4.185,2.65 -3.435,2.65 ; -1.645,-2.65 -0.895,-2.65 ; -1.645,2.65 -0.895,2.65 ; 0.895,-2.65 1.645,-2.65 ; 0.895,2.65 1.645,2.65 ; 3.435,-2.65 4.185,-2.65 ; 3.435,2.65 4.185,2.65 ; 5.975,-2.65 6.725,-2.65 ; 5.975,2.65 6.725,2.65 ; 8.515,-2.65 9.265,-2.65 ; 8.515,2.65 9.265,2.65 ; 11.055,-2.65 11.805,-2.65 ; 11.055,2.65 11.805,2.65 ; 13.595,-2.65 14.345,-2.65 ; 13.595,2.65 14.345,2.65 ; 16.135,-2.65 16.885,-2.65 ; 16.135,2.65 16.885,2.65 ; 18.675,-2.65 19.425,-2.65 ; 18.675,2.65 19.425,2.65 ; 21.215,-2.65 21.965,-2.65 ; 21.215,2.65 21.965,2.65 ; 23.755,-2.65 24.505,-2.65 ; 23.755,2.65 24.505,2.65 ; 26.295,-2.65 27.045,-2.65 ; 26.295,2.65 27.045,2.65 ; 28.835,-2.65 29.32,-2.65 29.32,2.65 28.835,2.65
F.CrtYd:
  lines w0.05: -29.71,-4.17 -29.71,4.17 29.71,4.17 29.71,-4.17 -29.71,-4.17
F.Fab:
  lines w0.1: -28.44,2.54 -27.94,1.833 -27.44,2.54 ; -29.21,-2.54 -29.21,2.54 29.21,2.54 29.21,-2.54 -29.21,-2.54
  text "'.Designator'" at -4.047,-2.68 h1